# Altium footprint library PART.PcbLib: 407 footprints (part 24 of 26)
Each footprint in its own frame and in the unit in brackets; x right, y up, seen from the top. Pads: shape width x height; smd on the part's side, far side on the other; paste and mask are expansions set on the pad; w line width, h text height; cw(c..) or ccw(c..) is an arc to the next point about the centre after c.
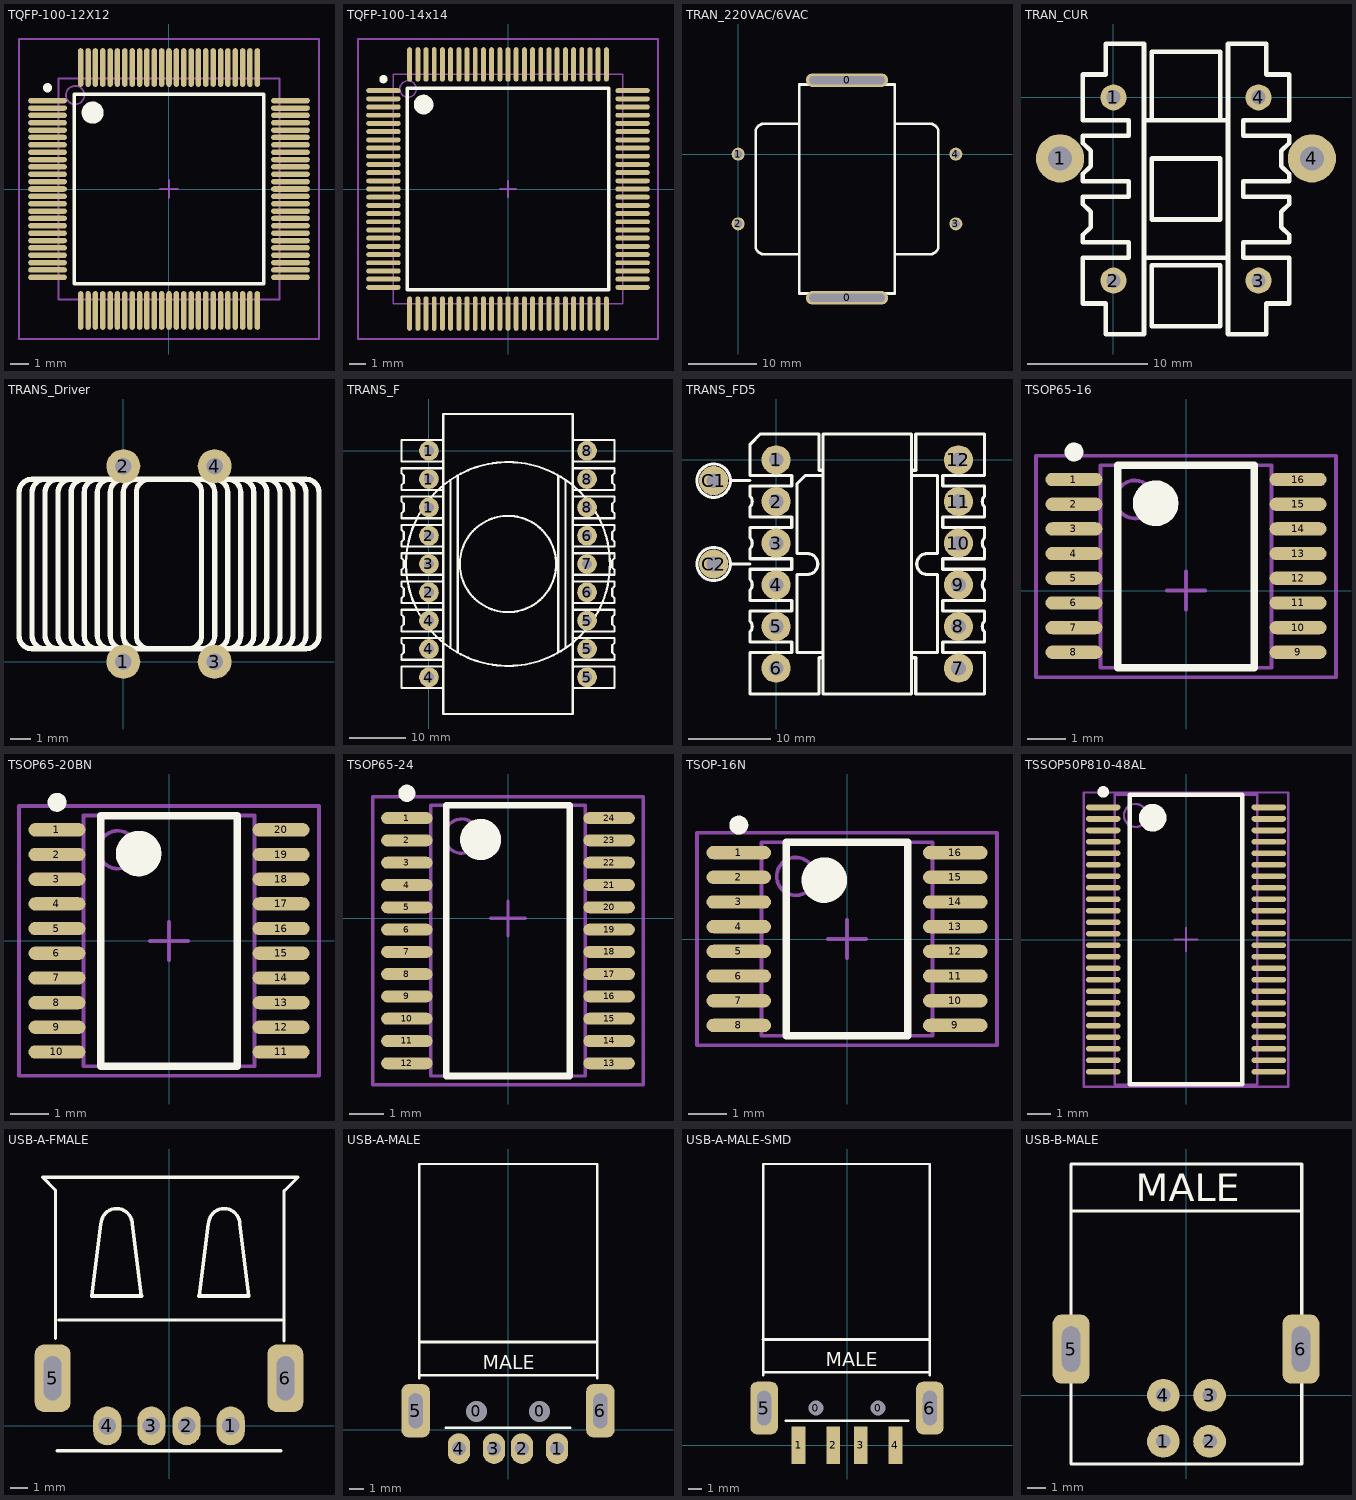
[diagram p23: the footprints below, top view; thin cyan lines are the x and y axes]

## TQFP-100-12X12 [mm] "Shrink QFP, 100-Leads, Body 12x12mm, Pitch 0.4mm, IPC High Density"
height 2.2
pads (100):
  oval 2.1x0.3 smd: 1(-6.6,4.8) 2(-6.6,4.4) 3(-6.6,4) 4(-6.6,3.6) 5(-6.6,3.2) 6(-6.6,2.8) 7(-6.6,2.4) 8(-6.6,2) 9(-6.6,1.6) 10(-6.6,1.2) 11(-6.6,0.8) 12(-6.6,0.4) 13(-6.6,0) 14(-6.6,-0.4) 15(-6.6,-0.8) 16(-6.6,-1.2) 17(-6.6,-1.6) 18(-6.6,-2) 19(-6.6,-2.4) 20(-6.6,-2.8) 21(-6.6,-3.2) 22(-6.6,-3.6) 23(-6.6,-4) 24(-6.6,-4.4) 25(-6.6,-4.8) 51(6.6,-4.8) 52(6.6,-4.4) 53(6.6,-4) 54(6.6,-3.6) 55(6.6,-3.2) 56(6.6,-2.8) 57(6.6,-2.4) 58(6.6,-2) 59(6.6,-1.6) 60(6.6,-1.2) 61(6.6,-0.8) 62(6.6,-0.4) 63(6.6,0) 64(6.6,0.4) 65(6.6,0.8) 66(6.6,1.2) 67(6.6,1.6) 68(6.6,2) 69(6.6,2.4) 70(6.6,2.8) 71(6.6,3.2) 72(6.6,3.6) 73(6.6,4) 74(6.6,4.4) 75(6.6,4.8)
  oval 0.3x2.1 smd: 26(-4.8,-6.6) 27(-4.4,-6.6) 28(-4,-6.6) 29(-3.6,-6.6) 30(-3.2,-6.6) 31(-2.8,-6.6) 32(-2.4,-6.6) 33(-2,-6.6) 34(-1.6,-6.6) 35(-1.2,-6.6) 36(-0.8,-6.6) 37(-0.4,-6.6) 38(0,-6.6) 39(0.4,-6.6) 40(0.8,-6.6) 41(1.2,-6.6) 42(1.6,-6.6) 43(2,-6.6) 44(2.4,-6.6) 45(2.8,-6.6) 46(3.2,-6.6) 47(3.6,-6.6) 48(4,-6.6) 49(4.4,-6.6) 50(4.8,-6.6) 76(4.8,6.6) 77(4.4,6.6) 78(4,6.6) 79(3.6,6.6) 80(3.2,6.6) 81(2.8,6.6) 82(2.4,6.6) 83(2,6.6) 84(1.6,6.6) 85(1.2,6.6) 86(0.8,6.6) 87(0.4,6.6) 88(0,6.6) 89(-0.4,6.6) 90(-0.8,6.6) 91(-1.2,6.6) 92(-1.6,6.6) 93(-2,6.6) 94(-2.4,6.6) 95(-2.8,6.6) 96(-3.2,6.6) 97(-3.6,6.6) 98(-4,6.6) 99(-4.4,6.6) 100(-4.8,6.6)
Top Overlay:
  circle w0.6: c-4.15,4.15 r0.3
  circle w0.25: c-6.6,5.5 r0.125
  lines w0.2: -5.15,-5.15 5.15,-5.15 5.15,5.15 -5.15,5.15 -5.15,-5.15
Mechanical 13:
  circle w0.1: c-5.1,5.1 r0.5
  lines w0.1: -6,-6 6,-6 6,6 -6,6 -6,-6
Mechanical 15:
  lines w0.1: -0.5,0 0.5,0 ; 0,-0.5 0,0.5 ; -8.15,-8.15 8.15,-8.15 8.15,8.15 -8.15,8.15 -8.15,-8.15
3D body: height 2.2, standoff 0, extent -6,-6 6,6

## TQFP-100-14x14 [mm] "Thin QFP, 100-Leads, Body 14x14mm, Pitch 0.5mm, IPC Low Density"
height 1.6
pads (100):
  oval 2.1x0.3 smd: 1(-7.6,6) 2(-7.6,5.5) 3(-7.6,5) 4(-7.6,4.5) 5(-7.6,4) 6(-7.6,3.5) 7(-7.6,3) 8(-7.6,2.5) 9(-7.6,2) 10(-7.6,1.5) 11(-7.6,1) 12(-7.6,0.5) 13(-7.6,0) 14(-7.6,-0.5) 15(-7.6,-1) 16(-7.6,-1.5) 17(-7.6,-2) 18(-7.6,-2.5) 19(-7.6,-3) 20(-7.6,-3.5) 21(-7.6,-4) 22(-7.6,-4.5) 23(-7.6,-5) 24(-7.6,-5.5) 25(-7.6,-6) 51(7.6,-6) 52(7.6,-5.5) 53(7.6,-5) 54(7.6,-4.5) 55(7.6,-4) 56(7.6,-3.5) 57(7.6,-3) 58(7.6,-2.5) 59(7.6,-2) 60(7.6,-1.5) 61(7.6,-1) 62(7.6,-0.5) 63(7.6,0) 64(7.6,0.5) 65(7.6,1) 66(7.6,1.5) 67(7.6,2) 68(7.6,2.5) 69(7.6,3) 70(7.6,3.5) 71(7.6,4) 72(7.6,4.5) 73(7.6,5) 74(7.6,5.5) 75(7.6,6)
  oval 0.3x2.1 smd: 26(-6,-7.6) 27(-5.5,-7.6) 28(-5,-7.6) 29(-4.5,-7.6) 30(-4,-7.6) 31(-3.5,-7.6) 32(-3,-7.6) 33(-2.5,-7.6) 34(-2,-7.6) 35(-1.5,-7.6) 36(-1,-7.6) 37(-0.5,-7.6) 38(0,-7.6) 39(0.5,-7.6) 40(1,-7.6) 41(1.5,-7.6) 42(2,-7.6) 43(2.5,-7.6) 44(3,-7.6) 45(3.5,-7.6) 46(4,-7.6) 47(4.5,-7.6) 48(5,-7.6) 49(5.5,-7.6) 50(6,-7.6) 76(6,7.6) 77(5.5,7.6) 78(5,7.6) 79(4.5,7.6) 80(4,7.6) 81(3.5,7.6) 82(3,7.6) 83(2.5,7.6) 84(2,7.6) 85(1.5,7.6) 86(1,7.6) 87(0.5,7.6) 88(0,7.6) 89(-0.5,7.6) 90(-1,7.6) 91(-1.5,7.6) 92(-2,7.6) 93(-2.5,7.6) 94(-3,7.6) 95(-3.5,7.6) 96(-4,7.6) 97(-4.5,7.6) 98(-5,7.6) 99(-5.5,7.6) 100(-6,7.6)
Top Overlay:
  circle w0.25: c-7.6,6.7 r0.125
  circle w0.6: c-5.15,5.15 r0.3
  lines w0.2: -6.15,-6.15 -6.15,6.15 6.15,6.15 6.15,-6.15 -6.15,-6.15
Mechanical 13:
  circle w0.1: c-6.1,6.1 r0.5
  lines w0.1: -7,-7 -7,7 7,7 7,-7 -7,-7
Mechanical 15:
  lines w0.1: -0.5,0 0.5,0 ; 0,-0.5 0,0.5 ; -9.15,-9.15 -9.15,9.15 9.15,9.15 9.15,-9.15 -9.15,-9.15
3D body: height 1.6, standoff 0, extent -7,-7 7,7

## TRAN_220VAC/6VAC [mm]
pads (6):
  oval 12x2 hole 1.2 slot 11 at 0 deg: 0(15.875,-20.955) 0(15.875,10.795)
  round 1.905 hole 1.2: 1(0,0) 2(0,-10.16) 3(31.75,-10.16) 4(31.75,0)
Top Overlay:
  lines w0.381: 8.89,-14.605 3.81,-14.605 cw(c3.81,-13.335) 2.54,-13.335 2.54,3.175 cw(c3.81,3.175) 3.81,4.445 8.89,4.445 ; 22.86,-14.605 27.94,-14.605 ccw(c27.94,-13.335) 29.21,-13.335 29.21,3.175 ccw(c27.94,3.175) 27.94,4.445 22.86,4.445 ; 8.89,-20.32 22.86,-20.32 22.86,10.16 8.89,10.16 8.89,-20.32

## TRAN_CUR [mm]
pads (6):
  round 4 hole 2: 1(-4.445,-5.08) 4(16.51,-5.08)
  round 2.159 hole 1.2: 1(0,0) 2(0,-15.24) 3(12.065,-15.24) 4(12.065,0)
Top Overlay:
  lines w0.381: 2.54,-13.335 9.525,-13.335 ; 2.54,-1.905 9.525,-1.905 ; 3.175,-1.905 3.175,3.81 8.89,3.81 8.89,-1.905 ; -2.54,-17.145 -2.54,-13.335 1.27,-13.335 1.27,-12.065 -2.54,-12.065 -2.54,-11.43 -1.905,-10.795 -1.905,-9.525 -2.54,-8.89 -2.54,-8.255 1.27,-8.255 1.27,-6.985 -2.54,-6.985 -2.54,-6.35 -1.905,-5.715 -1.905,-4.445 -2.54,-3.81 -2.54,-3.175 1.27,-3.175 1.27,-1.905 -2.54,-1.905 -2.54,1.905 -0.635,1.905 -0.635,4.445 2.54,4.445 2.54,-19.685 -0.635,-19.685 -0.635,-17.145 -2.54,-17.145 ; 3.175,-19.05 8.89,-19.05 8.89,-13.97 3.175,-13.97 3.175,-19.05 ; 3.175,-10.16 8.89,-10.16 8.89,-5.08 3.175,-5.08 3.175,-10.16 ; 9.525,-19.685 12.7,-19.685 12.7,-17.145 14.605,-17.145 14.605,-13.335 10.795,-13.335 10.795,-12.065 14.605,-12.065 14.605,-11.43 13.97,-10.795 13.97,-9.525 14.605,-8.89 14.605,-8.255 10.795,-8.255 10.795,-6.985 14.605,-6.985 14.605,-6.35 13.97,-5.715 13.97,-4.445 14.605,-3.81 14.605,-3.175 10.795,-3.175 10.795,-1.905 14.605,-1.905 14.605,1.905 12.7,1.905 12.7,4.445 9.525,4.445 9.525,-19.685

## TRANS_Driver [mil]
pads (4):
  round 65 hole 31.5: 1(0,0) 2(0,375) 3(175,0) 4(175,375)
Top Overlay:
  lines w10: -150,25 cw(c-150,50) -175,50 -175,325 cw(c-150,325) -150,350 ; -125,25 cw(c-125,50) -150,50 -150,325 cw(c-125,325) -125,350 ; -100,25 cw(c-100,50) -125,50 -125,325 cw(c-100,325) -100,350 ; -75,25 cw(c-75,50) -100,50 -100,325 cw(c-75,325) -75,350 ; -50,25 cw(c-50,50) -75,50 -75,325 cw(c-50,325) -50,350 ; -25,25 cw(c-25,50) -50,50 -50,325 cw(c-25,325) -25,350 ; 0,25 cw(c0,50) -25,50 -25,325 cw(c0,325) 0,350 ; 25,25 cw(c25,50) 0,50 0,325 cw(c25,325) 25,350 ; 50,25 cw(c50,50) 25,50 25,325 cw(c50,325) 50,350 ; 125,25 ccw(c125,50) 150,50 150,325 ccw(c125,325) 125,350 ; 150,25 ccw(c150,50) 175,50 175,325 ccw(c150,325) 150,350 ; 175,25 ccw(c175,50) 200,50 200,325 ccw(c175,325) 175,350 ; 200,25 ccw(c200,50) 225,50 225,325 ccw(c200,325) 200,350 ; 225,25 ccw(c225,50) 250,50 250,325 ccw(c225,325) 225,350 ; 250,25 ccw(c250,50) 275,50 275,325 ccw(c250,325) 250,350 ; 275,25 ccw(c275,50) 300,50 300,325 ccw(c275,325) 275,350 ; 300,25 ccw(c300,50) 325,50 325,325 ccw(c300,325) 300,350 ; 325,25 ccw(c325,50) 350,50 350,325 ccw(c325,325) 325,350 ; -200,50 ccw(c-175,50) -175,25 350,25 ccw(c350,50) 375,50 375,325 ccw(c350,325) 350,350 -175,350 ccw(c-175,325) -200,325 -200,50

## TRANS_F [mm]
pads (18):
  round 3.5 hole 1.8: 1(0,-10) 1(0,-5) 1(0,0) 2(0,-25) 2(0,-15) 3(0,-20) 4(0,-40) 4(0,-35) 4(0,-30) 5(27.94,-40) 5(27.94,-35) 5(27.94,-30) 6(27.94,-25) 6(27.94,-15) 7(27.94,-20) 8(27.94,-10) 8(27.94,-5) 8(27.94,0)
Top Overlay:
  circle w0.381: c13.97,-20 r8.5
  circle w0.381: c13.97,-20 r18
  lines w0.381: 2.286,-41.905 -4.826,-41.905 -4.826,-38.095 2.286,-38.095 ; 2.286,-36.905 -4.826,-36.905 -4.826,-36.016 -4.445,-35.635 -4.445,-34.365 -4.826,-33.984 -4.826,-33.73 -4.826,-33.095 2.286,-33.095 ; 2.286,-31.905 -4.826,-31.905 -4.826,-31.016 -4.445,-30.635 -4.445,-29.365 -4.826,-28.984 -4.826,-28.73 -4.826,-28.095 2.286,-28.095 ; 2.286,-26.905 -4.826,-26.905 -4.826,-26.016 -4.445,-25.635 -4.445,-24.365 -4.826,-23.984 -4.826,-23.73 -4.826,-23.095 2.286,-23.095 ; 2.286,-21.905 -4.826,-21.905 -4.826,-21.016 -4.445,-20.635 -4.445,-19.365 -4.826,-18.984 -4.826,-18.73 -4.826,-18.095 2.286,-18.095 ; 2.286,-16.905 -4.826,-16.905 -4.826,-16.016 -4.445,-15.635 -4.445,-14.365 -4.826,-13.984 -4.826,-13.73 -4.826,-13.095 2.286,-13.095 ; 2.286,-11.905 -4.826,-11.905 -4.826,-11.016 -4.445,-10.635 -4.445,-9.365 -4.826,-8.984 -4.826,-8.73 -4.826,-8.095 2.286,-8.095 ; 2.286,-6.905 -4.826,-6.905 -4.826,-6.016 -4.445,-5.635 -4.445,-4.365 -4.826,-3.984 -4.826,-3.73 -4.826,-3.095 2.286,-3.095 ; 2.286,-1.905 -4.826,-1.905 -4.826,1.905 2.286,1.905 ; 3.81,-34.798 3.81,-5.232 ; 5.08,-35.56 5.08,-4.42 ; 22.86,-35.611 22.86,-4.42 ; 24.13,-34.747 24.13,-5.283 ; 25.654,-41.905 32.766,-41.905 32.766,-38.095 25.654,-38.095 ; 25.654,-36.905 32.766,-36.905 32.766,-36.016 32.385,-35.635 32.385,-34.365 32.766,-33.984 32.766,-33.73 32.766,-33.095 25.654,-33.095 ; 25.654,-31.905 32.766,-31.905 32.766,-31.016 32.385,-30.635 32.385,-29.365 32.766,-28.984 32.766,-28.73 32.766,-28.095 25.654,-28.095 ; 25.654,-26.905 32.766,-26.905 32.766,-26.016 32.385,-25.635 32.385,-24.365 32.766,-23.984 32.766,-23.73 32.766,-23.095 25.654,-23.095 ; 25.654,-21.905 32.766,-21.905 32.766,-21.016 32.385,-20.635 32.385,-19.365 32.766,-18.984 32.766,-18.73 32.766,-18.095 25.654,-18.095 ; 25.654,-16.905 32.766,-16.905 32.766,-16.016 32.385,-15.635 32.385,-14.365 32.766,-13.984 32.766,-13.73 32.766,-13.095 25.654,-13.095 ; 25.654,-11.905 32.766,-11.905 32.766,-11.016 32.385,-10.635 32.385,-9.365 32.766,-8.984 32.766,-8.73 32.766,-8.095 25.654,-8.095 ; 25.654,-6.905 32.766,-6.905 32.766,-6.016 32.385,-5.635 32.385,-4.365 32.766,-3.984 32.766,-3.73 32.766,-3.095 25.654,-3.095 ; 25.654,-1.905 32.766,-1.905 32.766,1.905 25.654,1.905 ; 2.54,-46.5 25.4,-46.5 25.4,6.5 2.54,6.5 2.54,-46.5

## TRANS_FD5 [mil]
pads (14):
  round 140 hole 70.87: 1(0,0) 2(0,-200) 3(0,-400) 4(0,-600) 5(0,-800) 6(0,-1000) 7(875,-1000) 8(875,-800) 9(875,-600) 10(875,-400) 11(875,-200) 12(875,0) C1(-300,-100) C2(-300,-500)
Top Overlay:
  circle w15: c-300,-500 r80
  circle w15: c-300,-100 r80
  lines w15: -220,-500 -125,-500 ; -220,-100 -125,-100 ; 225,-950 205,-950 205,-1125 -125,-1125 -125,-975 -125,-925 75,-925 75,-875 -125,-875 -125,-825 ccw(c-150,-800) -125,-775 -125,-725 75,-725 75,-675 -125,-675 -125,-625 ccw(c-150,-600) -125,-575 -125,-525 75,-525 75,-475 -125,-475 -125,-425 ccw(c-150,-400) -125,-375 -125,-325 75,-325 75,-275 -125,-275 -125,-225 ccw(c-150,-200) -125,-175 -125,-125 75,-125 75,-75 -125,-75 -125,75 -75,125 5,125 205,125 205,-50 225,-50 ; 225,-925 100,-925 100,-550 150,-550 ccw(c150,-500) 150,-450 100,-450 100,-115 140,-75 225,-75 ; 650,-950 670,-950 670,-1125 1000,-1125 1000,-975 1000,-925 800,-925 800,-875 1000,-875 1000,-825 cw(c1025,-800) 1000,-775 1000,-725 800,-725 800,-675 1000,-675 1000,-625 cw(c1025,-600) 1000,-575 1000,-525 800,-525 800,-475 1000,-475 1000,-425 cw(c1025,-400) 1000,-375 1000,-325 800,-325 800,-275 1000,-275 1000,-225 cw(c1025,-200) 1000,-175 1000,-125 800,-125 800,-75 1000,-75 1000,125 870,125 670,125 670,-50 650,-50 ; 650,-925 775,-925 775,-550 725,-550 cw(c725,-500) 725,-450 775,-450 775,-75 650,-75 ; 225,-1125 225,125 650,125 650,-1125 225,-1125

## TSOP65-16 [mm] "TSOP, 20-Leads, Body 6.5x4.4mm, Pitch 0.65mm, IPC Medium Density"
height 1.2
pads (16):
  oval 1.5x0.35 smd: 1(-2.95,2.925) 2(-2.95,2.275) 3(-2.95,1.625) 4(-2.95,0.975) 5(-2.95,0.325) 6(-2.95,-0.325) 7(-2.95,-0.975) 8(-2.95,-1.625) 9(2.95,-1.625) 10(2.95,-0.975) 11(2.95,-0.325) 12(2.95,0.325) 13(2.95,0.975) 14(2.95,1.625) 15(2.95,2.275) 16(2.95,2.925)
Top Overlay:
  circle w0.6: c-0.8,2.3 r0.3
  circle w0.25: c-2.95,3.65 r0.125
  lines w0.2: -1.8,-2.032 1.8,-2.032 1.8,3.3 -1.8,3.3 -1.8,-2.032
Mechanical 13:
  circle w0.1: c-1.35,2.4 r0.5
  lines w0.1: -2.25,-2.032 2.25,-2.032 2.25,3.3 -2.25,3.3 -2.25,-2.032
Mechanical 15:
  lines w0.1: -0.5,0 0.5,0 ; 0,-0.5 0,0.5 ; -3.95,-2.282 3.95,-2.282 3.95,3.55 -3.95,3.55 -3.95,-2.282
3D body: height 1.2, standoff 0, extent -2.261,-2.032 2.25,3.3

## TSOP65-20BN [mm] "TSOP, 20-Leads, Body 6.5x4.4mm, Pitch 0.65mm, IPC Medium Density"
height 1.2
pads (20):
  oval 1.5x0.35 smd: 1(-2.95,2.925) 2(-2.95,2.275) 3(-2.95,1.625) 4(-2.95,0.975) 5(-2.95,0.325) 6(-2.95,-0.325) 7(-2.95,-0.975) 8(-2.95,-1.625) 9(-2.95,-2.275) 10(-2.95,-2.925) 11(2.95,-2.925) 12(2.95,-2.275) 13(2.95,-1.625) 14(2.95,-0.975) 15(2.95,-0.325) 16(2.95,0.325) 17(2.95,0.975) 18(2.95,1.625) 19(2.95,2.275) 20(2.95,2.925)
Top Overlay:
  circle w0.25: c-2.95,3.65 r0.125
  circle w0.6: c-0.8,2.3 r0.3
  lines w0.2: -1.8,-3.3 -1.8,3.3 1.8,3.3 1.8,-3.3 -1.8,-3.3
Mechanical 13:
  circle w0.1: c-1.35,2.4 r0.5
  lines w0.1: -2.25,-3.3 -2.25,3.3 2.25,3.3 2.25,-3.3 -2.25,-3.3
Mechanical 15:
  lines w0.1: -0.5,0 0.5,0 ; 0,-0.5 0,0.5 ; -3.95,-3.55 -3.95,3.55 3.95,3.55 3.95,-3.55 -3.95,-3.55
3D body: height 1.2, standoff 0, extent -2.25,-3.3 2.25,3.3

## TSOP65-24 [mm] "TSOP, 24-Leads, Body 6.5x4.4mm, Pitch 0.65mm, IPC Medium Density"
height 1.2
pads (24):
  oval 1.5x0.35 smd: 1(-2.95,2.925) 2(-2.95,2.275) 3(-2.95,1.625) 4(-2.95,0.975) 5(-2.95,0.325) 6(-2.95,-0.325) 7(-2.95,-0.975) 8(-2.95,-1.625) 9(-2.95,-2.275) 10(-2.95,-2.925) 11(-2.95,-3.575) 12(-2.95,-4.225) 13(2.95,-4.225) 14(2.95,-3.575) 15(2.95,-2.925) 16(2.95,-2.275) 17(2.95,-1.625) 18(2.95,-0.975) 19(2.95,-0.325) 20(2.95,0.325) 21(2.95,0.975) 22(2.95,1.625) 23(2.95,2.275) 24(2.95,2.925)
Top Overlay:
  circle w0.25: c-2.95,3.65 r0.125
  circle w0.6: c-0.8,2.3 r0.3
  lines w0.2: -1.8,-4.595 1.8,-4.595 ; -1.8,-4.572 -1.8,3.3 1.8,3.3 1.8,-4.572
Mechanical 13:
  circle w0.1: c-1.35,2.4 r0.5
  lines w0.1: -2.25,-4.595 2.25,-4.595 ; -2.25,-4.572 -2.25,3.3 2.25,3.3 2.25,-4.572
Mechanical 15:
  lines w0.1: -3.95,-4.845 3.95,-4.845 ; -3.95,-4.826 -3.95,3.55 3.95,3.55 3.95,-4.826 ; -0.5,0 0.5,0 ; 0,-0.5 0,0.5
3D body: height 1.2, standoff 0, extent -2.25,-4.597 2.261,3.3

## TSOP-16N [mm] "TSOP, 16-Leads, Body 5x4.4mm, Pitch 0.65mm, IPC Medium Density"
height 1.1
pads (16):
  oval 1.7x0.35 smd: 1(-2.85,2.275) 2(-2.85,1.625) 3(-2.85,0.975) 4(-2.85,0.325) 5(-2.85,-0.325) 6(-2.85,-0.975) 7(-2.85,-1.625) 8(-2.85,-2.275) 9(2.85,-2.275) 10(2.85,-1.625) 11(2.85,-0.975) 12(2.85,-0.325) 13(2.85,0.325) 14(2.85,0.975) 15(2.85,1.625) 16(2.85,2.275)
Top Overlay:
  circle w0.25: c-2.85,3 r0.125
  circle w0.6: c-0.6,1.55 r0.3
  lines w0.2: -1.6,-2.55 -1.6,2.55 1.6,2.55 1.6,-2.55 -1.6,-2.55
Mechanical 13:
  circle w0.1: c-1.35,1.65 r0.5
  lines w0.1: -2.25,-2.55 -2.25,2.55 2.25,2.55 2.25,-2.55 -2.25,-2.55
Mechanical 15:
  lines w0.1: -0.5,0 0.5,0 ; 0,-0.5 0,0.5 ; -3.95,-2.8 -3.95,2.8 3.95,2.8 3.95,-2.8 -3.95,-2.8
3D body: height 1.1, standoff 0, extent -2.25,-2.55 2.25,2.55

## TSSOP50P810-48AL [mm] "TSSOP, 48-Leads, Body 12.5x6.1mm, Pitch 0.5mm, IPC High Density"
height 1.2
pads (48):
  oval 1.5x0.25 smd: 1(-3.6,5.75) 2(-3.6,5.25) 3(-3.6,4.75) 4(-3.6,4.25) 5(-3.6,3.75) 6(-3.6,3.25) 7(-3.6,2.75) 8(-3.6,2.25) 9(-3.6,1.75) 10(-3.6,1.25) 11(-3.6,0.75) 12(-3.6,0.25) 13(-3.6,-0.25) 14(-3.6,-0.75) 15(-3.6,-1.25) 16(-3.6,-1.75) 17(-3.6,-2.25) 18(-3.6,-2.75) 19(-3.6,-3.25) 20(-3.6,-3.75) 21(-3.6,-4.25) 22(-3.6,-4.75) 23(-3.6,-5.25) 24(-3.6,-5.75) 25(3.6,-5.75) 26(3.6,-5.25) 27(3.6,-4.75) 28(3.6,-4.25) 29(3.6,-3.75) 30(3.6,-3.25) 31(3.6,-2.75) 32(3.6,-2.25) 33(3.6,-1.75) 34(3.6,-1.25) 35(3.6,-0.75) 36(3.6,-0.25) 37(3.6,0.25) 38(3.6,0.75) 39(3.6,1.25) 40(3.6,1.75) 41(3.6,2.25) 42(3.6,2.75) 43(3.6,3.25) 44(3.6,3.75) 45(3.6,4.25) 46(3.6,4.75) 47(3.6,5.25) 48(3.6,5.75)
Top Overlay:
  circle w0.25: c-3.6,6.425 r0.125
  circle w0.6: c-1.45,5.3 r0.3
  lines w0.2: -2.45,-6.3 -2.45,6.3 2.45,6.3 2.45,-6.3 -2.45,-6.3
Mechanical 13:
  circle w0.1: c-2.2,5.4 r0.5
  lines w0.1: -3.1,-6.3 -3.1,6.3 3.1,6.3 3.1,-6.3 -3.1,-6.3
Mechanical 15:
  lines w0.1: -0.5,0 0.5,0 ; 0,-0.5 0,0.5 ; -4.45,-6.4 -4.45,6.4 4.45,6.4 4.45,-6.4 -4.45,-6.4
3D body: height 1.2, standoff 0, extent -3.1,-6.3 3.1,6.3

## USB-A-FMALE [mm] "USB A connector, 4pin, For USB sing"
height 2.54
pads (6):
  oval 1.6x2.2 hole 1: 1(3.5,0) 2(1,0) 3(-1,0) 4(-3.5,0)
  rrect50% 2.032x3.81 hole 1 slot 2.5 at 90 deg: 5(-6.6,2.7) 6(6.6,2.7)
Top Overlay:
  lines w0.178: -6.432,4.953 -6.432,13.335 ; -6.432,13.366 -7.163,14.097 7.315,14.097 6.522,13.304 ; -6.337,-1.41 6.337,-1.41 ; -6.274,6 6.426,6 ; 6.522,4.826 6.522,13.335
  lines w0.203: -2.083,11.43 ccw(c-2.972,11.43) -2.972,12.319 ccw(c-2.972,11.43) -3.861,11.43 -4.369,7.366 -1.549,7.366 ; -2.083,11.455 -1.575,7.391 ; 1.702,7.366 4.521,7.366 4.013,11.43 ccw(c3.124,11.43) 3.124,12.319 ccw(c3.124,11.43) 2.235,11.43 ; 1.727,7.391 2.235,11.455

## USB-A-MALE [mm] "USB A connector, 4pin, For USB sing"
height 2.54
pads (8):
  round 1.45 hole 1.5: 0(-2.25,1.303) 0(2.25,1.303)
  oval 1.6x2.2 hole 1: 1(3.5,-1.35) 2(1,-1.35) 3(-1,-1.35) 4(-3.5,-1.35)
  rrect50% 2.032x3.81 hole 1 slot 2.5 at 90 deg: 5(-6.6,1.35) 6(6.6,1.35)
Top Overlay:
  lines w0.178: -6.325,3.683 -6.325,18.97 6.375,18.97 6.375,3.683 ; -6.325,3.903 6.375,3.903 ; -4.445,0.127 4.445,0.127
  lines w0.203: -6.325,6.27 6.375,6.27
  text "MALE" at -1.807,4.318 h1

## USB-A-MALE-SMD [mm] "For USB SMD"
height 3.81
pads (8):
  round 1 hole 1.1: 0(-2.25,2.7) 0(2.25,2.7)
  rect 1x2.7 smd: 1(-3.5,0) 2(-1,0) 3(1,0) 4(3.5,0)
  rrect50% 2x3.81 hole 1 slot 2.5 at 90 deg: 5(-6,2.7) 6(6,2.7)
Top Overlay:
  lines w0.178: -6.071,5.08 -6.071,20.367 5.994,20.367 5.994,5.08 ; -6.071,5.3 5.994,5.3 ; -4.445,1.778 4.445,1.778
  lines w0.203: -6.071,7.667 5.994,7.667
  text "MALE" at -1.553,5.715 h1

## USB-B-MALE [mm] "USB B connector, 4pin, For Print"
height 2.54
pads (6):
  round 1.8 hole 0.8: 1(-1.245,-2.54) 2(1.295,-2.54) 3(1.295,0) 4(-1.245,0)
  rrect50% 2.032x3.81 hole 1 slot 2.5 at 90 deg: 5(-6.325,2.54) 6(6.325,2.54)
Top Overlay:
  lines w0.178: -6.325,10.135 6.375,10.135 ; -6.325,-3.785 6.375,-3.785 6.375,12.725 -6.325,12.725 -6.325,-3.785
  text "MALE" at -2.769,10.668 h1.52
3D body: height 11.34, standoff -3.38, extent -7.526,-3.607 7.373,12.693